# Altium schematic symbol library Electronic Devices_LIB.SchLib: 703 symbols (part 5 of 8) (continued)
## IC_RF_TRANSMITTER_433MHz_WL4456
designator U?, comment WL4456
40Kbps 250MHz~450MHz SOT-23-6 RF Transceiver ICs ROHS; Manufacturer: WL; Frequency Range: 250-450 MHz; Transmitter Current: 17mA; Manufacturer part number: WL4456; Supplier: LCSC; ComponentLink1Description: Supplier; ComponentLink1URL: https://www.lcsc.com/product-detail/RF-Transceiver-ICs_WL-WL4456_C2917281.html; ComponentLink2Description: Datasheet; ComponentLink2URL: https://datasheet.lcsc.com/lcsc/2111101730_WL-WL4456_C2917281.pdf
footprint IC_SOT23-6_RF_SOT95P280X135-6N (SOT23, 6-Leads, Body 2.92x2.80mm, Pitch 0.95mm, IPC Medium Density)
pins: 1 XOUT, 2 VSS, 3 PAOUT, 4 DIN, 5 VDD, 6 XIN

## IC_SENSOR_TOUCH_ABM01B
designator U?, comment ABM01B
SOT-23-6 Touch Sensors ROHS; Packcage: SOT23-6L; Supplier: LCSC; ComponentLink1Description: link supplier; ComponentLink1URL: https://www.lcsc.com/product-detail/Touch-Sensors_Sam-wing-AM01B_C485387.html
footprint IC_SOT23-6_RF_SOT95P280X135-6N (SOT23, 6-Leads, Body 2.92x2.80mm, Pitch 0.95mm, IPC Medium Density)
pins: 1 OUT, 2 GND, 3 KEY, 4 VGM, 5 VDD, 6 HMD

## IC_SENSOR_TOUCH_JL423B
designator U?, comment JL423B
SOT-23-6 Touch Sensors ROHS; Packcage: SOT23-6L; Supplier: LCSC; ComponentLink1Description: link supplier
footprint IC_SOT23-6_RF_SOT95P280X135-6N (SOT23, 6-Leads, Body 2.92x2.80mm, Pitch 0.95mm, IPC Medium Density)
pins: 1 OUT, 2 GND, 3 SO, 4 SLH, 5 VDD, 6 STG

## IC_SOC_BLE_BLUENRG-132
designator U?, comment BLUENRG-132
Bluetooth low energy wireless system-on-chip | IC RF TXRX+MCU BLUETOOTH 32VFQFN; Manufacturer: STMicroelectronics; Interface: I2C,SPI,UART; Frequency: 2.4GHz; Data Rate: 1Mbps; Sensitivity: -88dBm; Memory Size: 24KB; Number of GPIO: 15; Current - Receiving: 7.7mA; Current - Transmitting: 15.1mA; Supplier 1: Digi-Key; Manufacturer Part Number: BLUENRG-132; RoHS: Yes; Category: RF Receivers, Transceivers; Stock 1: 2392; Pricing 1: 1=3.83, 10=3.437, 25=3.2496, 100=2.8164, 250=2.67192, 500=2.39752, 1000=2.0247 (USD); Min Operating Temperature: -40°C; Max Operating Temperature: 105°C; Packaging: Cut Tape; Series: BlueNRG; RoHS Compliant: Yes; ComponentLink1URL: http://www.farnell.com/datasheets/2363376.pdf?src-supplier=Farnell; ComponentLink1Description: http://www.farnell.com/datasheets/2363376.pdf?src-supplier=Farnell; ComponentLink2URL: http://www.farnell.com/datasheets/2363376.pdf?src-supplier=Newark; ComponentLink2Description: http://www.farnell.com/datasheets/2363376.pdf?src-supplier=Newark; ComponentLink3URL: https://datasheet.octopart.com/BLUENRG-132-STMicroelectronics-datasheet-77992476.pdf?src-supplier=Future+Electronics; ComponentLink3Description: https://datasheet.octopart.com/BLUENRG-132-STMicroelectronics-datasheet-77992476.pdf?src-supplier=Future+Electronics; ComponentLink4URL: http://www.st.com/content/ccc/resource/technical/document/user_manual/group0/b6/e0/6e/ef/bd/ed/4a/62/DM00286976/files/DM00286976.pdf/jcr:content/translations/en.DM00286976.pdf?src-supplier=Digi-Key; ComponentLink4Description: http://www.st.com/content/ccc/resource/technical/document/user_manual/group0/b6/e0/6e/ef/bd/ed/4a/62/DM00286976/files/DM00286976.pdf/jcr:content/translations/en.DM00286976.pdf?src-supplier=Digi-Key; Supplier Part Number 1: 497-16695-1-ND
footprint IC_SOC_QFN50P500X500X100-33N (QFN-32, 5 x 5 x 1 pitch 0.5 mm))
pins: 1 DIO10, 2 DIO9, 3 DIO8, 4 DIO7, 5 DIO6, 6 VBAT3, 7 DIO5, 8 DIO4, 9 DIO3, 10 DIO2, 11 DIO1, 12 DIO0, 13 ANATEST0/DIO14, 14 ANATEST1, 15 ADC1, 16 ADC2, 17 FXTAL1, 18 FXTAL0, 19 VBAT2, 20 RF1, 21 RF0, 22 SXTAL1, 23 SXTAL0, 24 VBAT1, 25 RESETN, 26 SMPSFILT1, 27 SMPSFILT2, 28 VDD1V2, 29 DIO13, 30 DIO12, 31 TEST, 32 DIO11, 33 GND

## IC_SOC_BLE_NRF52832-QFAA-R
designator U?, comment NRF52832-QFAA-R
Bluetooth v5.0 (BLE) SMART SOC IoT 2Mbps 3V 48-Pin QFN EP T/R; Manufacturer: Nordic Semiconductor; Frequency: 2.4GHz; Sensitivity: -96dBm; Memory Size: 64KB; Number of GPIO: 32; Interface: I2C,SPI,UART; Current - Receiving: 10.4mA; Current - Transmitting: 15.2mA; Supplier 1: Digi-Key; Manufacturer Part Number: NRF52832-QFAA-R; RoHS: Yes; Category: RF Receivers, Transceivers; Stock 1: 367525; Pricing 1: 1=5.53, 10=4.94, 25=4.4456, 100=4.0504, 250=3.65524, 500=3.27982, 1000=2.76612 (USD); Mount: Surface Mount; Case/Package: QFN; Number of Pins: 48; Min Operating Temperature: -40°C; Max Operating Temperature: 85°C; Packaging: Cut Tape; Data Rate: 2Mbps; Series: -; RoHS Compliant: Yes; ComponentLink1URL: http://www.mouser.com/ds/2/297/nRF52832%20Product%20Brief%20v1.2-890472.pdf?src-supplier=Mouser; ComponentLink1Description: http://www.mouser.com/ds/2/297/nRF52832%20Product%20Brief%20v1.2-890472.pdf?src-supplier=Mouser; ComponentLink2URL: http://infocenter.nordicsemi.com/pdf/nRF52832_PB_v1.7.pdf?src-supplier=Digi-Key; ComponentLink2Description: http://infocenter.nordicsemi.com/pdf/nRF52832_PB_v1.7.pdf?src-supplier=Digi-Key; ComponentLink3URL: http://infocenter.nordicsemi.com/pdf/nRF52832_PS_v1.4.pdf?src-supplier=Digi-Key; ComponentLink3Description: http://infocenter.nordicsemi.com/pdf/nRF52832_PS_v1.4.pdf?src-supplier=Digi-Key; ComponentLink4URL: https://datasheet.octopart.com/NRF52832-QFAA-R-Nordic-Semiconductor-datasheet-104421228.pdf?src-supplier=LKR; ComponentLink4Description: https://datasheet.octopart.com/NRF52832-QFAA-R-Nordic-Semiconductor-datasheet-104421228.pdf?src-supplier=LKR; Supplier Part Number 1: 4823-NRF52832-QFAA-RCT-ND
footprint IC_SOC_BLE_NORDIC_QFN40P600X600X90-49N-D (48-VFQFN, EXPOSED PAD, PITCH 0.4mm)
pins: 1 DEC1, 2 P0.00/XL1, 3 P0.01/XL2, 4 P0.02/AIN0, 5 P0.03/AIN1, 6 P0.04/AIN2, 7 P0.05/AIN3, 8 P0.06, 9 P0.07, 10 P0.08, 11 NFC1/P0.09, 12 NFC2/P0.10, 13 VDD_1, 14 P0.11, 15 P0.12, 16 P0.13, 17 P0.14/TRACEDATA[3], 18 P0.15/TRACEDATA[2], 19 P0.16/TRACEDATA[1], 20 P0.17, 21 P0.18/TRACEDATA[0]/SWO, 22 P0.19, 23 P0.20/TRACECLK, 24 P0.21/NRESET, 25 SWDCLK, 26 SWDIO, 27 P0.22, 28 P0.23, 29 P0.24, 30 ANT, 31 VSS_1, 32 DEC2, 33 DEC3, 34 XC1, 35 XC2, 36 VDD_2, 37 P0.25, 38 P0.26, 39 P0.27, 40 P0.28/AIN4, 41 P0.29/AIN5, 42 P0.30/AIN6, 43 P0.31/AIN7, 44 NC, 45 VSS_2, 46 DEC4, 47 DCC, 48 VDD_3, 49 PAD

## IC_SWITCH_TYPEC_CBTU02043HEJ
designator U?, comment CBTU02043HEJ
USB 3.1 Gen 1 Type C switch / TAPE + REEL REEL 13" Q1 NDP RoHS Compliant: Yes; Manufacturer: NXP Semiconductors; Supplier 1: Digikey; Manufacturer Part Number: CBTU02043HEJ; RoHS: Yes; Category: USB Interface ICs; Stock 1: 13678; Pricing 1: 1=1.72, 10=1.546, 25=1.458, 100=1.2424, 250=1.16656, 500=1.02074, 1000=0.84575, 2500=0.78742, 5000=0.75826 (USD); RoHS Compliant: Yes; ComponentLink1URL: http://www.farnell.com/datasheets/2615726.pdf?src-supplier=Farnell; ComponentLink1Description: http://www.farnell.com/datasheets/2615726.pdf?src-supplier=Farnell; ComponentLink2URL: http://www.farnell.com/datasheets/2615726.pdf?src-supplier=Newark; ComponentLink2Description: http://www.farnell.com/datasheets/2615726.pdf?src-supplier=Newark; Supplier Part Number 1: 568-13400-6-ND
footprint IC_SW_TYPEC_CBTU02044HEJ
pins: 1 B1_N, 2 B1_P, 3 XSD, 4 VDD (power), 5 C0_P, 6 C0_N, 7 B0_N, 8 B0_P, 9 A0_N, 10 A0_P, 11 VSS (power), 12 SEL, 13 A1_P, 14 A1_N, 15 C1_P, 16 C1_N, 17 EPAD (power)

## IC_TRANSCEIVER_BLE_IS2083BM-232-TRAY
designator U?, comment IS2083BM-232-TRAY
Bluetooth Stereo Audio SoC 3.2V to 4.2V 82-Pin VFBGA Tray; Manufacturer: Microchip; Supplier 1: Digi-Key; Manufacturer Part Number: IS2083BM-232-TRAY; RoHS: No; Category: Embedded Processors and Controllers; Stock 1: 1420; Pricing 1: 1=7.41 (USD); Supplier Part Number 1: 150-IS2083BM-232-TRAY-ND
footprint IC_BLE_BGA82C50P10X10_550X550X90 (82-VFBGA, Pitch 0.5mm)
part A pins: A4 VDDA CODEC (power), A7 GND (power), A9 VCC BTPA (power), A10 VCC RF (power), B4 VCOM (power), B7 VCC PA1 (power), C8 VDD IO (power), D3 VDD IO (power), D10 ULPC VSUS, E5 GND (power), E10 VBG (power), F5 GND (power), F6 GND (power), G1 BAT IN (power), G8 USB 1V2/VDD CORE (power), H1 SARVDD (power), H5 VDD CORE (power), H8 AVDD USB/VDD IO 10 (power), H10 CLDO O/VDD PLL (power), J1 SYS POWER (power), J6 VDD CORE (power), K1 BK1 VDDC (power), K6 LDO31 VIN, K9 BK2 VDD (power)
part B pins: A1 MIC N2, A2 AOHPL, A3 AOHPM, A5 AOHPR, A6 PA1OP, A8 RTX, B1 MIC P2, B2 SCLK1, B3 RFS1, B5 P1 3/TCK CPU/SDA, B6 P1 2/TDI CPU/SCL, B8 P0 1, B9 P2 3, B10 XO P, C1 MIC N1, C2 DT1, C3 DR1, C6 NC, C9 P1 6/PWM1, C10 XO N, D1 MIC P1, D2 MCLK1, D8 ~{RST}, D9 P0 5, E1 MICBIAS, E2 DMIC CLK, E3 DMIC1 L, E6 P0 7, E8 P0 2, E9 P2 7, F1 ADAP IN, F2 DMIC1 R, F3 AIR, F8 P0 0/UART TX IND, F9 P0 3, F10 RFLDO O, G2 P3 2, G3 AIL, G9 P3 5, G10 PMIC IN, H2 P0 6, H3 P2 6, H9 P3 7/UART CTS, J2 P8 6/UART RXD, J3 P8 5/UART TXD, J4 SK1, J5 SK2, J7 P3 4/UART RTS, J8 LED1, J9 LED2, J10 USB DP, K2 BK1 LX1, K3 BK1 VOUT, K4 MFB, K5 LDO31 VO, K7 BK2 VOUT, K8 BK2 LX, K10 USB DM

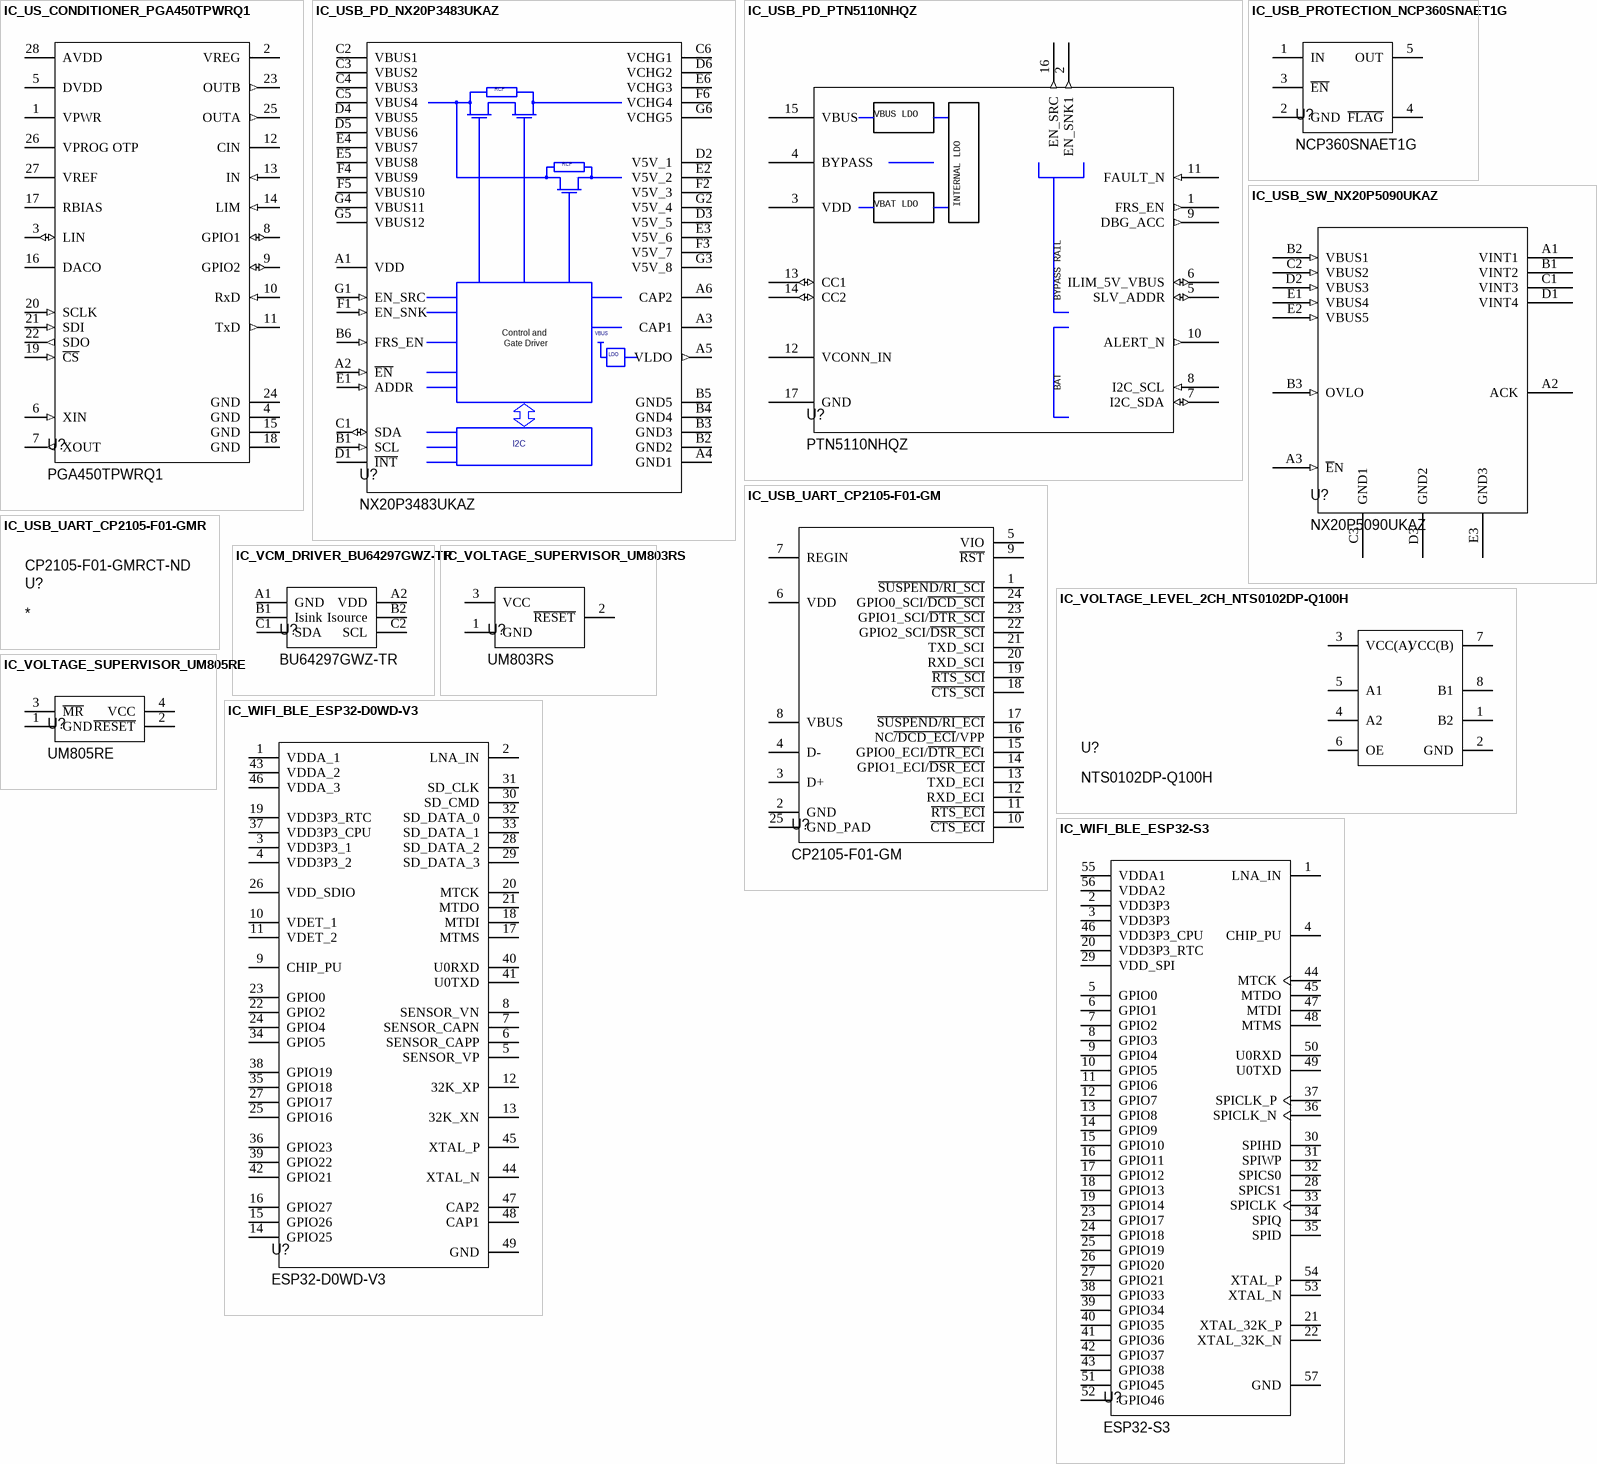
[diagram p28: symbols IC_US_CONDITIONER_PGA450TPWRQ1 to IC_WIFI_BLE_ESP32-S3]

## IC_US_CONDITIONER_PGA450TPWRQ1
designator U?, comment PGA450TPWRQ1
Ultrasonic-Sensor Signal Conditioner LIN 2.1/SPI/UART Interface 7V to 18V 28-Pin TSSOP T/R; Manufacturer: Texas Instruments; Interface: SPI,GPIO,UART,LIN,SCI; Max Input Voltage: 3V; Operating Supply Current: 15mA; Number of Channels: 1; Output Type: Digital; Supplier 1: Mouser; Manufacturer Part Number: PGA450TPWRQ1; RoHS: Yes; Category: Linear ICs; Stock 1: 1978; Pricing 1: 1=8.53, 10=7.71, 25=7.35, 50=7.35, 100=6.38, 250=6.1, 500=5.56, 1000=4.84, 2000=4.39, 10000=4.39 (USD); Mount: Surface Mount; Case/Package: TSSOP; Number of Pins: 28; Min Operating Temperature: -40°C; Max Operating Temperature: 125°C; Package Quantity: 2000; Packaging: Tape and Reel; Max Supply Voltage: 18V; Min Supply Voltage: 7V; Number of Inputs: 1; Series: Automotive, AEC-Q100; Supply Current: 15mA; Lead Free: Lead Free; RoHS Compliant: Yes; ComponentLink1URL: https://datasheet.ciiva.com/29643/pga450-q1-29643889.pdf?src-supplier=Digikey; ComponentLink1Description: https://datasheet.ciiva.com/29643/pga450-q1-29643889.pdf?src-supplier=Digikey; ComponentLink2URL: https://datasheet.ciiva.com/3276/pga450-q1-3276694.pdf?src-supplier=Avnet; ComponentLink2Description: https://datasheet.ciiva.com/3276/pga450-q1-3276694.pdf?src-supplier=Avnet; ComponentLink3URL: https://datasheet.ciiva.com/26808/getdatasheetpartid-620426-26808187.pdf?src-supplier=Verical; ComponentLink3Description: https://datasheet.ciiva.com/26808/getdatasheetpartid-620426-26808187.pdf?src-supplier=Verical; Supplier Part Number 1: 595-PGA450TPWRQ1
footprint IC_Texas_Instruments_PW0028A_IPC_A
pins: 1 VPWR (power), 2 VREG, 3 LIN (io), 4 GND (power), 5 DVDD (power), 6 XIN (in), 7 XOUT (out), 8 GPIO1 (io), 9 GPIO2 (io), 10 RxD (in), 11 TxD (out), 12 CIN, 13 IN (in), 14 LIM (in), 15 GND (power), 16 DACO, 17 RBIAS, 18 GND (power), 19 ~{CS} (in), 20 SCLK (in), 21 SDI (in), 22 SDO (out), 23 OUTB (out), 24 GND (power), 25 OUTA (out), 26 VPROG OTP, 27 VREF, 28 AVDD (power)

## IC_USB_PD_NX20P3483UKAZ
designator U?, comment NX20P3483UKAZ
USB PD and Type-C high voltage sink/source combo switch with protection; Manufacturer: NXP Semiconductors; Nominal Input Voltage: 20V; Supplier 1: Newark; Manufacturer Part Number: NX20P3483UKAZ; RoHS: Yes; Category: Uncategorized; Stock 1: 1282; Pricing 1: 1=3.29 (USD); RoHS Compliant: Yes; Supplier Part Number 1: 02AH2123
footprint IC_USB_PD_NX20P3483 (WLCSP42_0P4_2P94X2P54_SMDP)
pins: A1 VDD (power), A2 ~{EN} (in), A3 CAP1, A4 GND1 (power), A5 VLDO (out), A6 CAP2, B1 SCL (in), B2 GND2 (power), B3 GND3 (power), B4 GND4 (power), B5 GND5 (power), B6 FRS_EN (in), C1 SDA (io), C2 VBUS1 (power), C3 VBUS2 (power), C4 VBUS3 (power), C5 VBUS4 (power), C6 VCHG1, D1 ~{INT} (oc), D2 V5V_1 (power), D3 V5V_5 (power), D4 VBUS5 (power), D5 VBUS6 (power), D6 VCHG2, E1 ADDR (in), E2 V5V_2 (power), E3 V5V_6 (power), E4 VBUS7 (power), E5 VBUS8 (power), E6 VCHG3, F1 EN_SNK (in), F2 V5V_3 (power), F3 V5V_7 (power), F4 VBUS9 (power), F5 VBUS10 (power), F6 VCHG4, G1 EN_SRC (in), G2 V5V_4 (power), G3 V5V_8 (power), G4 VBUS11 (power), G5 VBUS12 (power), G6 VCHG5

## IC_USB_PD_PTN5110NHQZ
designator U?, comment PTN5110NHQZ
Low Speed/Full Speed/High Speed USB Power Delivery Controller USB 3.1 3.3V T/R 16-Pin HX2QFN EP; Manufacturer: NXP Semiconductors; Supplier 1: Digikey; Manufacturer Part Number: PTN5110NHQZ; RoHS: No; Category: Interface ICs; Stock 1: 2147; Pricing 1: 1=2.17, 10=1.951, 25=1.8404, 100=1.5679, 250=1.47216, 500=1.28816, 1000=1.06733 (USD); Supplier Part Number 1: 568-13797-1-ND
footprint IC_USB_PD_QFN40P260X260X40-17N-D (QFN)
pins: 1 FRS_EN (out), 2 EN_SNK1 (out), 3 VDD (power), 4 BYPASS, 5 SLV_ADDR (io), 6 ILIM_5V_VBUS (io), 7 I2C_SDA (io), 8 I2C_SCL (in), 9 DBG_ACC (out), 10 ALERT_N (out), 11 FAULT_N (in), 12 VCONN_IN (power), 13 CC1 (io), 14 CC2 (io), 15 VBUS (power), 16 EN_SRC (out), 17 GND (power)

## IC_USB_PROTECTION_NCP360SNAET1G
designator U?, comment NCP360SNAET1G
NCP360 Series 3 V Threshold 20 V USB Positive Overvoltage Protection Controller; Manufacturer: ON Semiconductor; Max Supply Voltage: 20V; Min Supply Voltage: 1.2V; Number of Voltages Monitored: 1; Threshold Voltage: 3V; Watchdog Timer: No; Clamping Voltage: 7.4V; Supplier 1: Digikey; Manufacturer Part Number: NCP360SNAET1G; RoHS: Yes; Category: Voltage Supervisors; Stock 1: 2385; Pricing 1: 1=0.68, 10=0.534, 100=0.439, 500=0.382, 1000=0.351, 3000=0.294, 6000=0.2925, 9000=0.29125 (USD); Mount: Surface Mount; Case/Package: TSOP; Number of Pins: 5; Min Operating Temperature: -40°C; Max Operating Temperature: 85°C; Packaging: Tape and Reel; Package Quantity: 3000; Number of Circuits: 1; Series: -; Number of Outputs: 1; Length: 0.118inch; Width: 0.059inch; Height: 0.039inch; Radiation Hardening: No; Lead Free: Lead Free; Halogen Free: Halogen Free; RoHS Compliant: Yes; ComponentLink1URL: https://datasheet.ciiva.com/4901/ncp360-d-85706-4901232.pdf?src-supplier=Mouser; ComponentLink1Description: https://datasheet.ciiva.com/4901/ncp360-d-85706-4901232.pdf?src-supplier=Mouser; ComponentLink2URL: https://datasheet.ciiva.com/361/ncp360-d-361400.pdf?src-supplier=Digikey; ComponentLink2Description: https://datasheet.ciiva.com/361/ncp360-d-361400.pdf?src-supplier=Digikey; ComponentLink3URL: https://datasheet.ciiva.com/361/ncp360-d-361401.pdf?src-supplier=Digikey; ComponentLink3Description: https://datasheet.ciiva.com/361/ncp360-d-361401.pdf?src-supplier=Digikey; ComponentLink4URL: https://datasheet.ciiva.com/361/ncp360-d-361402.pdf?src-supplier=Digikey; ComponentLink4Description: https://datasheet.ciiva.com/361/ncp360-d-361402.pdf?src-supplier=Digikey; ComponentLink5URL: https://datasheet.ciiva.com/8142/ncp360-d-8142763.pdf?src-supplier=Avnet; ComponentLink5Description: https://datasheet.ciiva.com/8142/ncp360-d-8142763.pdf?src-supplier=Avnet; ComponentLink6URL: https://datasheet.ciiva.com/16469/ncp360-d-16469653.pdf?src-supplier=Future+Electronics; ComponentLink6Description: https://datasheet.ciiva.com/16469/ncp360-d-16469653.pdf?src-supplier=Future+Electronics; Supplier Part Number 1: NCP360SNAET1GOSCT-ND
footprint IC_USB_PROT_SOT95P275X110-5N
pins: 1 IN, 2 GND (power), 3 ~{EN}, 4 ~{FLAG}, 5 OUT

## IC_USB_SW_NX20P5090UKAZ
designator U?, comment NX20P5090UKAZ
High Voltage USB PD Power Switch / REEL REEL 7" Q2 DP SPECIAL MARK CHIPS RoHS Compliant: Yes; Manufacturer: NXP Semiconductors; Number of Outputs: 1; On-State Resistance: 30mR; Supplier 1: Digikey; Manufacturer Part Number: NX20P5090UKAZ; RoHS: Yes; Category: USB Interface ICs; Stock 1: 15235; Pricing 1: 1=1.77, 10=1.586, 25=1.496, 100=1.2744, 250=1.19664, 500=1.04706, 1000=0.86757 (USD); Number of Pins: 15; Min Operating Temperature: -40°C; Max Operating Temperature: 85°C; Packaging: Cut Tape; Reach SVHC Compliant: No; RoHS Compliant: Yes; ComponentLink1URL: http://www.farnell.com/datasheets/2057111.pdf?src-supplier=Farnell; ComponentLink1Description: http://www.farnell.com/datasheets/2057111.pdf?src-supplier=Farnell; ComponentLink2URL: http://www.mouser.com/ds/2/302/NX20P5090-1099118.pdf?src-supplier=Mouser; ComponentLink2Description: http://www.mouser.com/ds/2/302/NX20P5090-1099118.pdf?src-supplier=Mouser; ComponentLink3URL: http://www.farnell.com/datasheets/2057111.pdf?src-supplier=Element14; ComponentLink3Description: http://www.farnell.com/datasheets/2057111.pdf?src-supplier=Element14; ComponentLink4URL: https://datasheet.octopart.com/NX20P5090UKAZ-NXP-Semiconductors-datasheet-62336705.pdf?src-supplier=Newark; ComponentLink4Description: https://datasheet.octopart.com/NX20P5090UKAZ-NXP-Semiconductors-datasheet-62336705.pdf?src-supplier=Newark; ComponentLink5URL: http://www.farnell.com/datasheets/2057111.pdf?src-supplier=Newark; ComponentLink5Description: http://www.farnell.com/datasheets/2057111.pdf?src-supplier=Newark; Supplier Part Number 1: 568-12897-1-ND
footprint IC_USB_NX20P5090UKAZ
pins: A1 VINT1 (power), A2 ACK (oc), A3 ~{E}N (in), B1 VINT2 (power), B2 VBUS1 (in), B3 OVLO (in), C1 VINT3 (power), C2 VBUS2 (in), C3 GND1 (power), D1 VINT4 (power), D2 VBUS3 (in), D3 GND2 (power), E1 VBUS4 (in), E2 VBUS5 (in), E3 GND3 (power)

## IC_USB_UART_CP2105-F01-GM
designator U?, comment CP2105-F01-GM
IC SGL USB-DL UART BRIDGE 24QFN; Manufacturer: Silicon Labs; Number of Channels: 1; Max Supply Voltage: 3.6V; Min Supply Voltage: 3V; Data Rate: 12Mbps; Operating Supply Current: 17mA; Operating Supply Voltage: 3.3V; Supplier 1: Digi-Key; Manufacturer Part Number: CP2105-F01-GM; RoHS: Yes; Category: USB Interface ICs; Stock 1: 3004; Pricing 1: 1=5.17, 10=4.639, 25=4.386, 100=3.8011, 250=3.6062, 500=3.23584, 1000=2.72902, 2500=2.59257 (USD); Case/Package: QFN; Number of Pins: 24; Weight: 0.001368oz; Contact Plating: Tin,Matte; Min Operating Temperature: -40°C; Max Operating Temperature: 85°C; Packaging: Rail/Tube; Package Quantity: 91; Number of Transceivers: 1; Series: -; Length: 4mm; Width: 4mm; Height: 0.75mm; Radiation Hardening: No; RoHS Compliant: Yes; ComponentLink1URL: https://datasheet.ciiva.com/25624/0900766b811077c5-25624105.pdf?src-supplier=Rs; ComponentLink1Description: https://datasheet.ciiva.com/25624/0900766b811077c5-25624105.pdf?src-supplier=Rs; ComponentLink2URL: https://datasheet.ciiva.com/1784/cp2105-1784466.pdf?src-supplier=Digi-Key; ComponentLink2Description: https://datasheet.ciiva.com/1784/cp2105-1784466.pdf?src-supplier=Digi-Key; ComponentLink3URL: https://datasheet.ciiva.com/3148/cp2105-3148817.pdf?src-supplier=Avnet; ComponentLink3Description: https://datasheet.ciiva.com/3148/cp2105-3148817.pdf?src-supplier=Avnet; ComponentLink4URL: https://datasheet.ciiva.com/26815/getdatasheetpartid-358512-26815926.pdf?src-supplier=Verical; ComponentLink4Description: https://datasheet.ciiva.com/26815/getdatasheetpartid-358512-26815926.pdf?src-supplier=Verical; Supplier Part Number 1: 336-2009-5-ND
footprint IC_USB_UART_QFN50P400X400X80-25N-D (24-QFN (4x4))
pins: 1 ~{SUSPEND/RI_SCI}, 2 GND, 3 D+, 4 D-, 5 VIO, 6 VDD, 7 REGIN, 8 VBUS, 9 ~{RST}, 10 ~{CTS_ECI}, 11 ~{RTS_ECI}, 12 RXD_ECI, 13 TXD_ECI, 14 GPIO1_ECI/~{DSR_ECI}, 15 GPIO0_ECI/~{DTR_EC}I, 16 NC~{/DCD_ECI}/VPP, 17 ~{SUSPEND/RI_ECI}, 18 ~{CTS_SCI}, 19 ~{RTS_SCI}, 20 RXD_SCI, 21 TXD_SCI, 22 GPIO2_SCI/~{DSR_SCI}, 23 GPIO1_SCI/~{DTR_SCI}, 24 GPIO0_SCI/~{DCD_SCI}, 25 GND_PAD

## IC_USB_UART_CP2105-F01-GMR
designator U?  Supplier Part Number 1: CP2105-F01-GMRCT-ND
IC SGL USB-DL UART BRIDGE 24QFN; Manufacturer: Silicon Labs; Manufacturer Part Number: CP2105-F01-GMR; Number of Channels: 1; Max Supply Voltage: 3.6V; Min Supply Voltage: 3V; Number of I/Os: 5; Operating Supply Current: 17mA; Data Rate: 2Mbps; ESD Protection: Yes; Supplier 1: Digikey; RoHS: Yes; Category: Interface ICs; Stock 1: 10683; Pricing 1: 1=5.17, 10=4.639, 25=4.386, 100=3.8011, 250=3.6062, 500=3.23584, 1500=2.4125 (USD); Mount: Surface Mount; Case/Package: QFN; Number of Pins: 24; Weight: 0.001764oz; Min Operating Temperature: -40°C; Max Operating Temperature: 85°C; Packaging: Tape and Reel; Package Quantity: 1500; Interface: UART; Number of Transceivers: 1; Series: -; Length: 4mm; Width: 4mm; Height: 0.75mm; ComponentLink1URL: https://datasheet.ciiva.com/12097/cp2105-25736-12097507.pdf?src-supplier=Mouser; ComponentLink1Description: https://datasheet.ciiva.com/12097/cp2105-25736-12097507.pdf?src-supplier=Mouser; ComponentLink2URL: https://datasheet.ciiva.com/14939/cp2105-short-14939946.pdf?src-supplier=Digikey; ComponentLink2Description: https://datasheet.ciiva.com/14939/cp2105-short-14939946.pdf?src-supplier=Digikey

## IC_VCM_DRIVER_BU64297GWZ-TR
designator U?, comment BU64297GWZ-TR
Bi-directional VCM driver for Auto focus, UCSP35L1, RoHS; Manufacturer: Rohm; Supplier 1: Mouser; Manufacturer Part Number: BU64297GWZ-TR; RoHS: Yes; Category: Motors and Drives; Stock 1: 5965; Pricing 1: 1=0.83, 10=0.686, 50=0.686, 100=0.52, 500=0.443, 1000=0.354, 3000=0.328, 6000=0.298, 9000=0.287, 10000=0.287, 24000=0.276 (USD); RoHS Compliant: Yes; Supplier Part Number 1: 755-BU64297GWZ-TR
footprint IC_VCM1_DRIVER (6-XFBGA, CSPBGA)
pins: A1 GND, A2 VDD, B1 Isink, B2 Isource, C1 SDA, C2 SCL

## IC_VOLTAGE_LEVEL_2CH_NTS0102DP-Q100H
designator U?, comment NTS0102DP-Q100H
Voltage Level Translator 2-CH Bidirectional Automotive 8-Pin TSSOP T/R; Manufacturer: NXP Semiconductors; Max Supply Voltage: 5.5V; Min Supply Voltage: 1.65V; Propagation Delay: 4.4ns; Data Rate: 50Mbps; Number of Channels: 2; Number of Circuits: 1; High Level Output Current: -20uA; Low Level Output Current: 1mA; Quiescent Current: 30uA; Turn-On Delay Time: 280ns; Supplier 1: Digi-Key; Manufacturer Part Number: NTS0102DP-Q100H; RoHS: Yes; Category: Logic Gates; Stock 1: 17947; Pricing 1: 1=1.16, 10=1.034, 25=0.982, 100=0.8065, 250=0.75396, 500=0.66628, 1000=0.52601 (USD); Mount: Surface Mount; Case/Package: TSSOP; Number of Pins: 8; Min Operating Temperature: -40°C; Max Operating Temperature: 125°C; Packaging: Tape and Reel; Package Quantity: 3000; Logic Function: Translator; Number of Bits: 2; Channel Type: Bidirectional; Output Type: Voltage; Series: Automotive, AEC-Q100; Radiation Hardening: No; RoHS Compliant: Yes; ComponentLink1URL: https://datasheet.ciiva.com/15048/nts0102-q100-15048565.pdf?src-supplier=Digi-Key; ComponentLink1Description: https://datasheet.ciiva.com/15048/nts0102-q100-15048565.pdf?src-supplier=Digi-Key; Supplier Part Number 1: 568-12380-1-ND
footprint IC_VOLTAGE_LEVEL_SOP65P400X110-8N (8-TSSOP)
pins: 1 B2, 2 GND, 3 VCC(A), 4 A2, 5 A1, 6 OE, 7 VCC(B), 8 B1

## IC_VOLTAGE_SUPERVISOR_UM803RS
designator U?, comment UM803RS
3-Pin Microprocessor Reset Circuits; Manufacturer: Union Semiconductor; Supplier 1: Arrow Electronics; Manufacturer Part Number: UM803RS; RoHS: No; Stock 1: 2840; Pricing 1: 1=0.1121 (USD); Supplier Part Number 1: UM803RS
footprint IC_SUP_VOL_UM805RS (SOT-23-3)
pins: 1 GND, 2 ~{RESET}, 3 VCC

## IC_VOLTAGE_SUPERVISOR_UM805RE
designator U?, comment UM805RE
Supervisor Open Drain or Open Collector 1 Channel SOT-143; Manufacturer: Union Semiconductor International Limited; Manufacturer Part Number: UM805RE; ComponentLink1Description: Suplier link; ComponentLink1URL: https://www.digikey.com/en/products/detail/union-semiconductor-international-limited/UM805RE/21265144?s=N4IgTCBcDaIKoFkAcAGArAJQKIgLoF8g; Category: Integrated Circuit
footprint IC_SUP_VOL_UM805RE (SOT-143)
pins: 1 GND, 2 ~{RESET}, 3 ~{MR}, 4 VCC

## IC_WIFI_BLE_ESP32-D0WD-V3
designator U?, comment ESP32-D0WD-V3
WIFI-Bluetooth Combo Chip 2412MHz to 2483MHz 3.3V 48-Pin QFN; Manufacturer: Espressif Systems; Interface: I2C,SPI,ADC,PWM,SDIO,UART; Data Rate: 150Mbps; Frequency: 2.484GHz; Sensitivity: -97dBm; Memory Size: 520KB; Current - Receiving: 100mA; Current - Transmitting: 240mA; Number of GPIO: 34; Supplier 1: Digi-Key; Manufacturer Part Number: ESP32-D0WD-V3; RoHS: No; Category: RF Receivers, Transceivers; Stock 1: 11927; Pricing 1: 1=1.5 (USD); Mount: Surface Mount; Case/Package: QFN; Min Operating Temperature: -40°C; Max Operating Temperature: 125°C; Series: ESP32; ComponentLink1URL: https://www.espressif.com/sites/default/files/documentation/esp32_datasheet_en.pdf?src-supplier=Digi-Key; ComponentLink1Description: https://www.espressif.com/sites/default/files/documentation/esp32_datasheet_en.pdf?src-supplier=Digi-Key; Supplier Part Number 1: 1904-ESP32-D0WD-V3CT-ND
footprint IC_WIFI_ESP32_DOWD_QFN35P500X500X90-49N-D (48-QFN (5x5))
pins: 1 VDDA_1, 2 LNA_IN, 3 VDD3P3_1, 4 VDD3P3_2, 5 SENSOR_VP, 6 SENSOR_CAPP, 7 SENSOR_CAPN, 8 SENSOR_VN, 9 CHIP_PU, 10 VDET_1, 11 VDET_2, 12 32K_XP, 13 32K_XN, 14 GPIO25, 15 GPIO26, 16 GPIO27, 17 MTMS, 18 MTDI, 19 VDD3P3_RTC, 20 MTCK, 21 MTDO, 22 GPIO2, 23 GPIO0, 24 GPIO4, 25 GPIO16, 26 VDD_SDIO, 27 GPIO17, 28 SD_DATA_2, 29 SD_DATA_3, 30 SD_CMD, 31 SD_CLK, 32 SD_DATA_0, 33 SD_DATA_1, 34 GPIO5, 35 GPIO18, 36 GPIO23, 37 VDD3P3_CPU, 38 GPIO19, 39 GPIO22, 40 U0RXD, 41 U0TXD, 42 GPIO21, 43 VDDA_2, 44 XTAL_N, 45 XTAL_P, 46 VDDA_3, 47 CAP2, 48 CAP1, 49 GND

## IC_WIFI_BLE_ESP32-S3
designator U?, comment ESP32-S3
QFN-56-EP(7x7) RF Transceiver ICs ROHS; Manufacturer: Espressif Systems; Supplier 1: Digi-Key; Manufacturer Part Number: ESP32-S3; RoHS: No; Category: RF Receivers, Transceivers; Stock 1: 4593; Pricing 1: 1=1.85 (USD); Supplier Part Number 1: 1965-ESP32-S3-ND
footprint IC_ESP32-S3 (56-QFN (7x7))
pins: 1 LNA_IN, 2 VDD3P3, 3 VDD3P3, 4 CHIP_PU, 5 GPIO0, 6 GPIO1, 7 GPIO2, 8 GPIO3, 9 GPIO4, 10 GPIO5, 11 GPIO6, 12 GPIO7, 13 GPIO8, 14 GPIO9, 15 GPIO10, 16 GPIO11, 17 GPIO12, 18 GPIO13, 19 GPIO14, 20 VDD3P3_RTC, 21 XTAL_32K_P, 22 XTAL_32K_N, 23 GPIO17, 24 GPIO18, 25 GPIO19, 26 GPIO20, 27 GPIO21, 28 SPICS1, 29 VDD_SPI, 30 SPIHD, 31 SPIWP, 32 SPICS0, 33 SPICLK, 34 SPIQ, 35 SPID, 36 SPICLK_N, 37 SPICLK_P, 38 GPIO33, 39 GPIO34, 40 GPIO35, 41 GPIO36, 42 GPIO37, 43 GPIO38, 44 MTCK, 45 MTDO, 46 VDD3P3_CPU, 47 MTDI, 48 MTMS, 49 U0TXD, 50 U0RXD, 51 GPIO45, 52 GPIO46, 53 XTAL_N, 54 XTAL_P, 55 VDDA1, 56 VDDA2, 57 GND

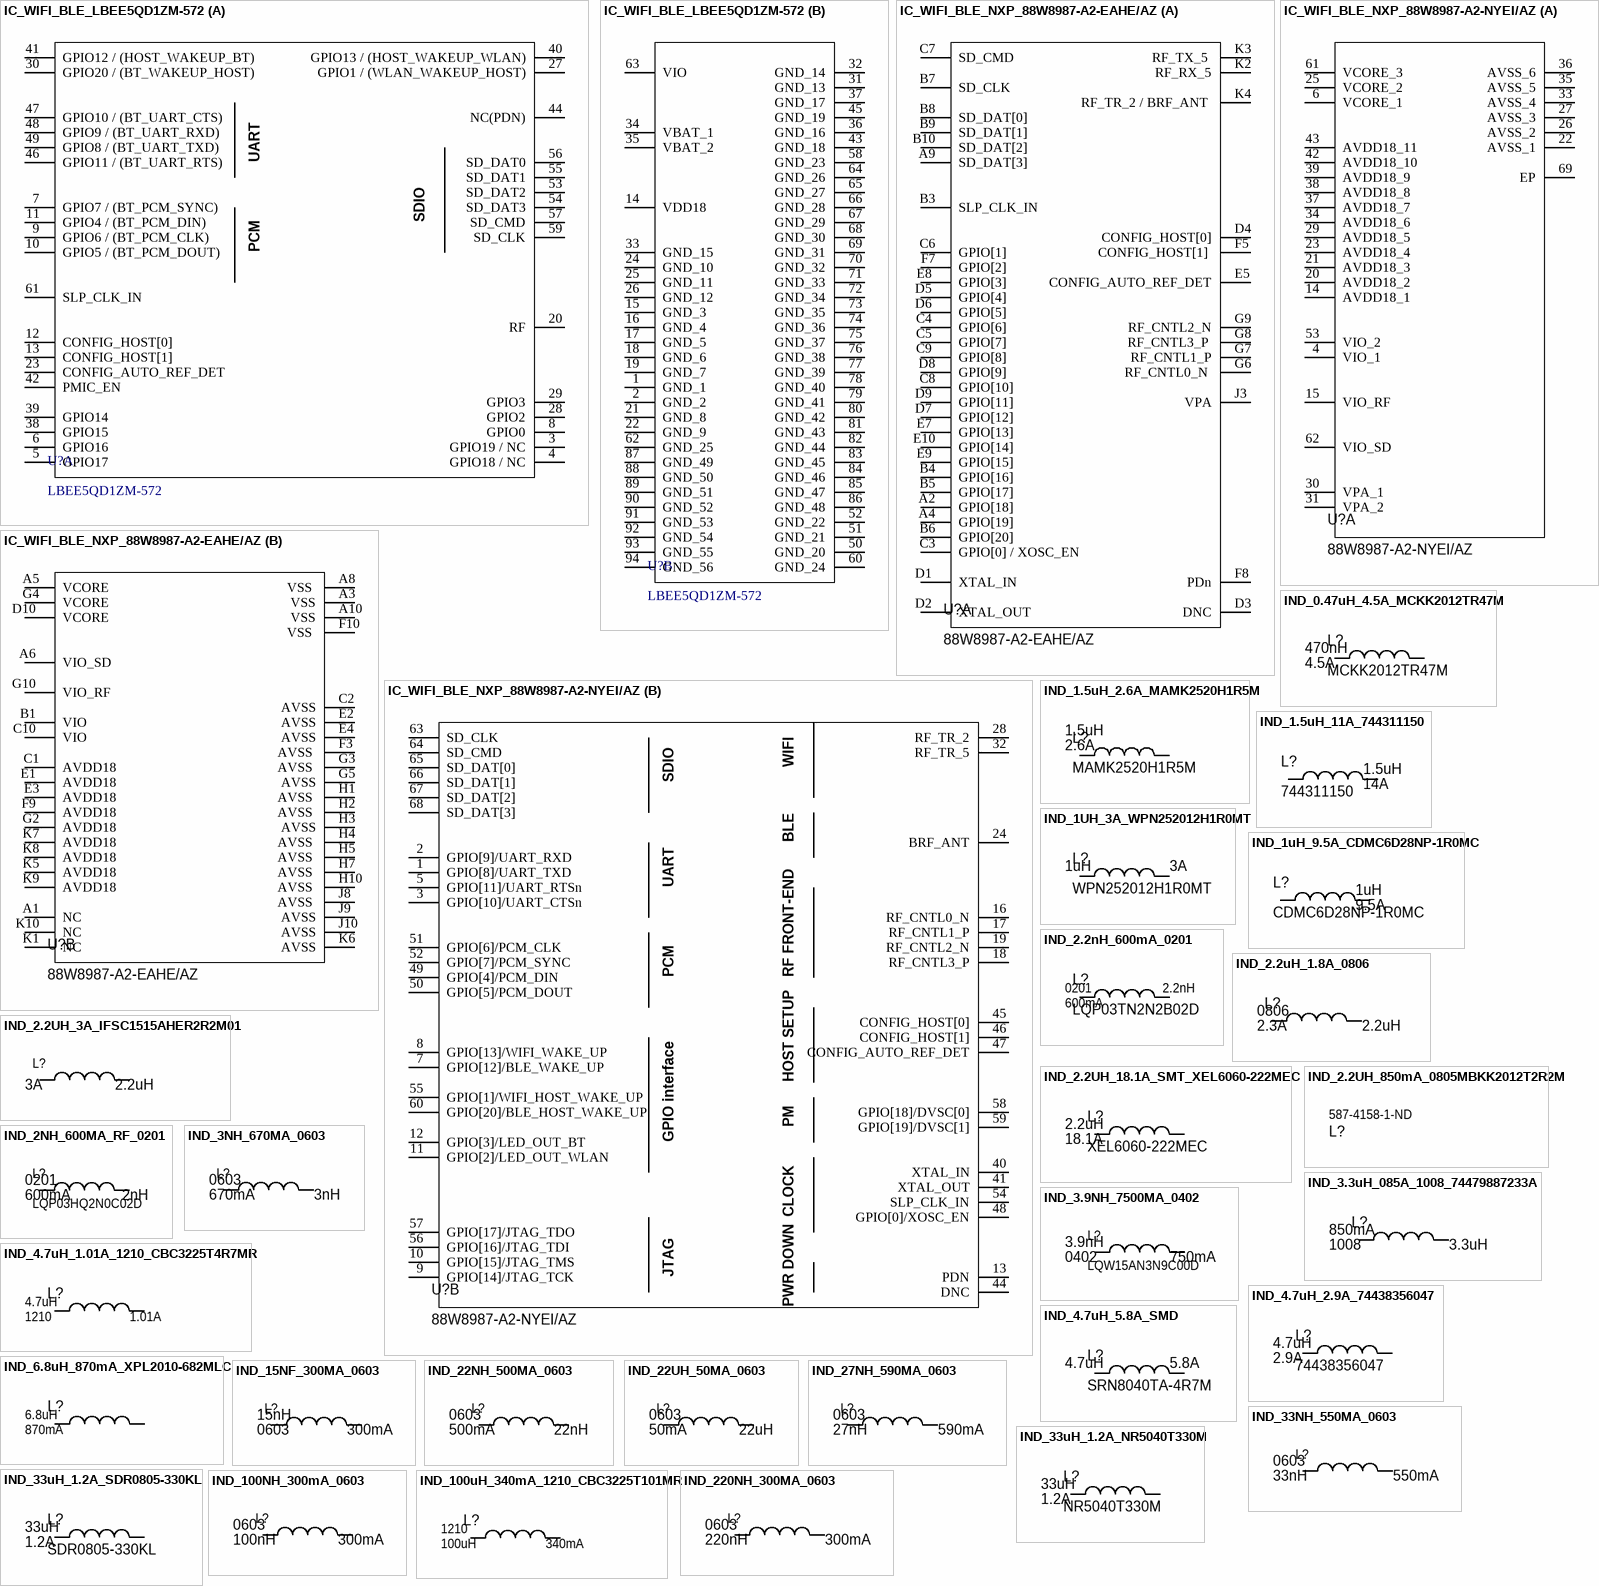
[diagram p29: symbols IC_WIFI_BLE_LBEE5QD1ZM-572 to IND_220NH_300MA_0603]

## IC_WIFI_BLE_LBEE5QD1ZM-572
designator U?, comment LBEE5QD1ZM-572
2.4 to 5.825GHz Bluetooth WiFi 802.11a/b/g/-c, Bluetooth v5.1 Transceiver Module; Manufacturer_Name: Murata Electronics; Manufacturer: Murata; Datasheet Link: https://pl.mouser.com/datasheet/2/281/1/murata_type1zm-2006876.pdf; Height: 1.345mm; Manufacturer_Part_Number: LBEE5QD1ZM-572; Mouser Part Number: 81-LBEE5QD1ZM-572; Mouser Price/Stock: https://www.mouser.co.uk/ProductDetail/Murata-Electronics/LBEE5QD1ZM-572?qs=stqOd1AaK79ZX7AUUzAj%2FQ%3D%3D; Arrow Part Number: LBEE5QD1ZM-572; Arrow Price/Stock: https://www.arrow.com/en/products/lbee5qd1zm-572/murata-manufacturing?region=nac; Supplier: Mouser; Supplier Part Number: 81-LBEE5QD1ZM-572; Manufacturer Part Number: LBEE5QD1ZM-572; RoHS: No; Stock: 926; Pricing: 1=17.82, 10=16.11, 25=14.82, 50=14.48, 100=13.43, 250=12.74, 500=11.95, 1000=11.35, 10000=11.35 (USD)
footprint IC_WIFI_BLE_LBEE5QD1ZM572
part A pins: 3 GPIO19 / NC, 4 GPIO18 / NC, 5 GPIO17, 6 GPIO16, 7 GPIO7 / (BT_PCM_SYNC) , 8 GPIO0, 9 GPIO6 / (BT_PCM_CLK), 10 GPIO5 / (BT_PCM_DOUT), 11 GPIO4 / (BT_PCM_DIN), 12 CONFIG_HOST[0], 13 CONFIG_HOST[1], 20 RF, 23 CONFIG_AUTO_REF_DET, 27 GPIO1 / (WLAN_WAKEUP_HOST), 28 GPIO2, 29 GPIO3, 30 GPIO20 / (BT_WAKEUP_HOST), 38 GPIO15, 39 GPIO14, 40 GPIO13 / (HOST_WAKEUP_WLAN), 41 GPIO12 / (HOST_WAKEUP_BT), 42 PMIC_EN, 44 NC(PDN), 46 GPIO11 / (BT_UART_RTS) , 47 GPIO10 / (BT_UART_CTS), 48 GPIO9 / (BT_UART_RXD), 49 GPIO8 / (BT_UART_TXD), 53 SD_DAT2, 54 SD_DAT3, 55 SD_DAT1, 56 SD_DAT0, 57 SD_CMD, 59 SD_CLK, 61 SLP_CLK_IN
part B pins: 1 GND_1, 2 GND_2, 14 VDD18, 15 GND_3, 16 GND_4, 17 GND_5, 18 GND_6, 19 GND_7, 21 GND_8, 22 GND_9, 24 GND_10, 25 GND_11, 26 GND_12, 31 GND_13, 32 GND_14, 33 GND_15, 34 VBAT_1, 35 VBAT_2, 36 GND_16, 37 GND_17, 43 GND_18, 45 GND_19, 50 GND_20, 51 GND_21, 52 GND_22, 58 GND_23, 60 GND_24, 62 GND_25, 63 VIO, 64 GND_26, 65 GND_27, 66 GND_28, 67 GND_29, 68 GND_30, 69 GND_31, 70 GND_32, 71 GND_33, 72 GND_34, 73 GND_35, 74 GND_36, 75 GND_37, 76 GND_38, 77 GND_39, 78 GND_40, 79 GND_41, 80 GND_42, 81 GND_43, 82 GND_44, 83 GND_45, 84 GND_46, 85 GND_47, 86 GND_48, 87 GND_49, 88 GND_50, 89 GND_51, 90 GND_52, 91 GND_53, 92 GND_54, 93 GND_55, 94 GND_56